# Altium footprint library Atlan.PcbLib: 283 footprints (part 7 of 18)
Each footprint in its own frame and in the unit in brackets; x right, y up, seen from the top. Pads: shape width x height; smd on the part's side, far side on the other; paste and mask are expansions set on the pad; w line width, h text height; cw(c..) or ccw(c..) is an arc to the next point about the centre after c.
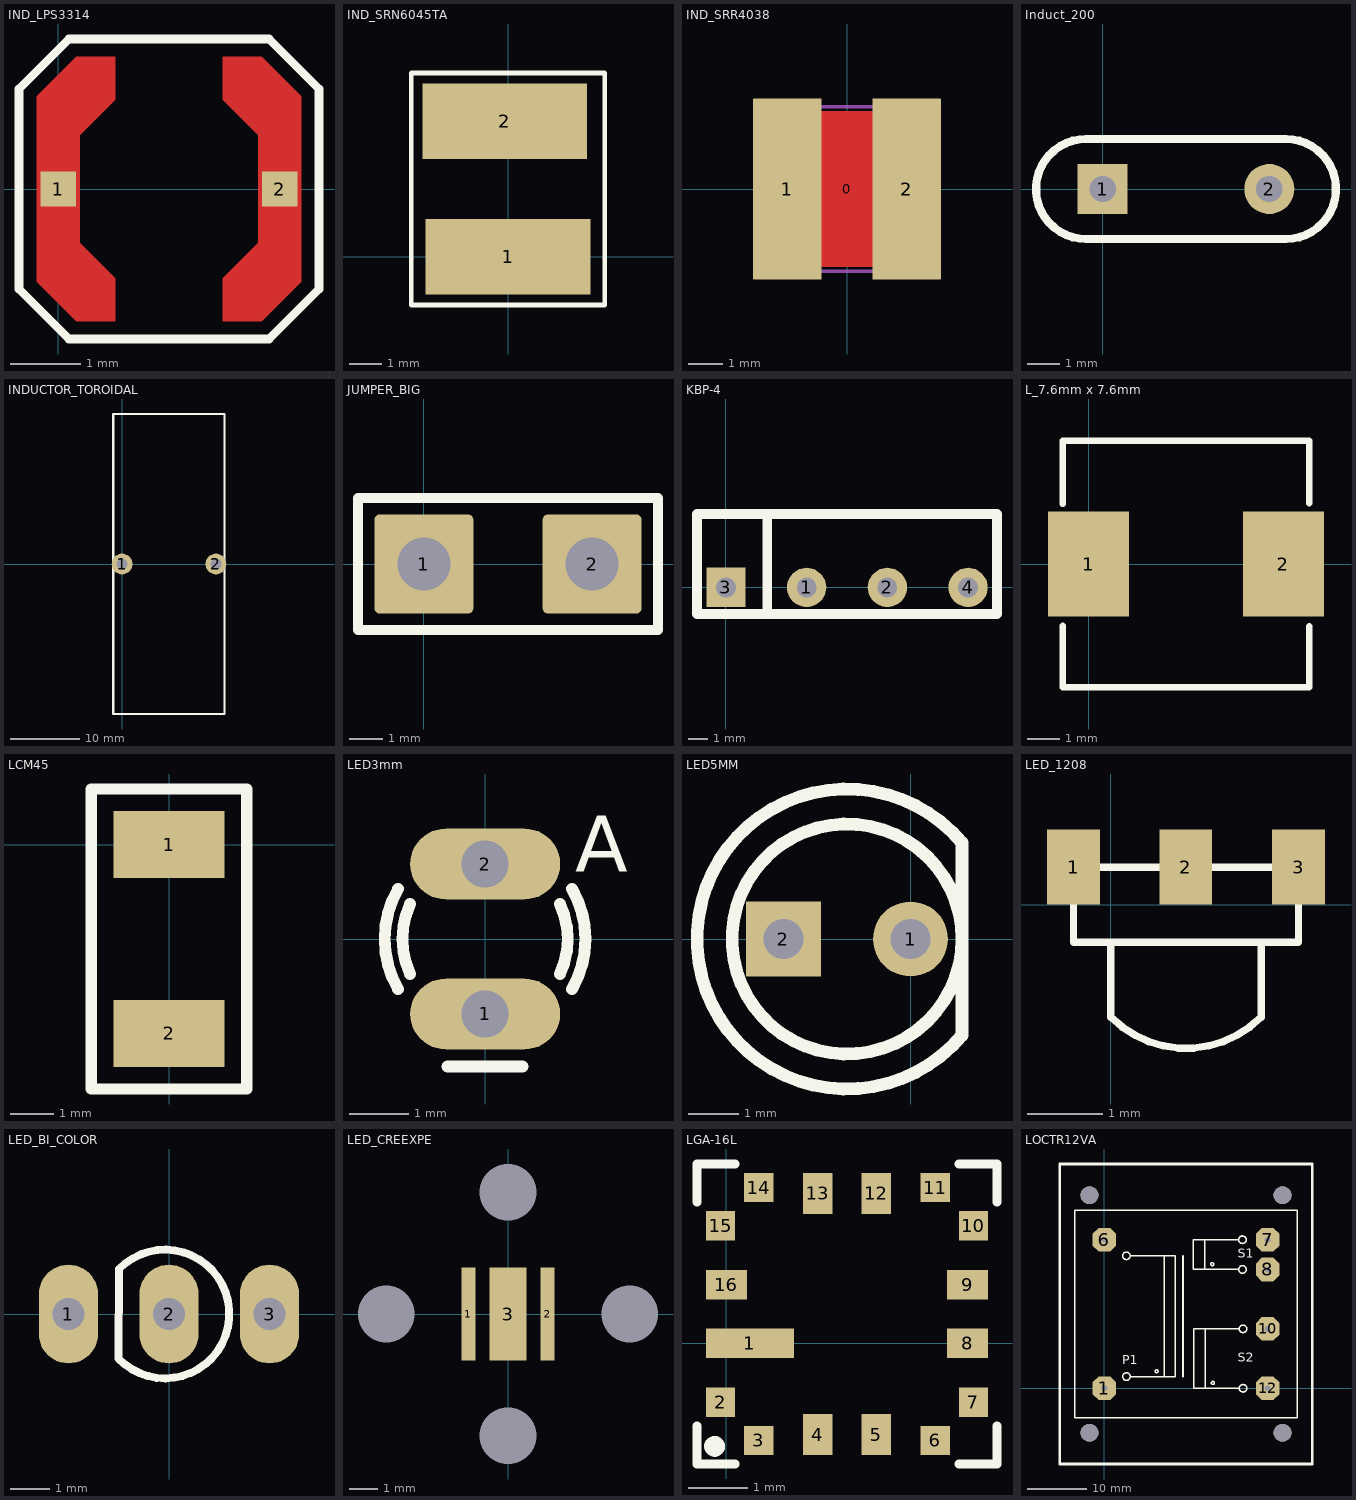
[diagram p6: the footprints below, top view; thin cyan lines are the x and y axes]

## IND_LPS3314 [mm] "Inductor"
pads (4):
  round 0 smd paste-25.4 mask-25.4: 1(0,0) 2(3.15,0)
  rect 0.5x0.5 smd: 1(0,0) 2(3.15,0)
Top Layer:
  region: 2.896,-1.88 3.454,-1.321 3.454,1.321 2.896,1.88 2.337,1.88 2.337,1.27 2.845,0.762 2.845,-0.762 2.337,-1.27 2.337,-1.88
  region: 0.254,1.88 -0.305,1.321 -0.305,-1.321 0.254,-1.88 0.813,-1.88 0.813,-1.27 0.305,-0.762 0.305,0.762 0.813,1.27 0.813,1.88
Top Overlay:
  lines w0.127: -0.559,-1.422 -0.559,1.422 0.152,2.134 2.997,2.134 3.708,1.422 3.708,-1.422 2.997,-2.134 0.152,-2.134 -0.559,-1.422
Top Paste:
  region: 2.896,-1.88 3.454,-1.321 3.454,1.321 2.896,1.88 2.337,1.88 2.337,1.27 2.845,0.762 2.845,-0.762 2.337,-1.27 2.337,-1.88
  region: 0.254,1.88 -0.305,1.321 -0.305,-1.321 0.254,-1.88 0.813,-1.88 0.813,-1.27 0.305,-0.762 0.305,0.762 0.813,1.27 0.813,1.88
Top Solder:
  region: 2.973,1.957 3.532,1.399 3.564,1.321 3.564,-1.321 3.532,-1.399 2.973,-1.957 2.896,-1.99 2.337,-1.99 2.259,-1.957 2.227,-1.88 2.227,-1.27 2.259,-1.192 2.735,-0.716 2.735,0.716 2.259,1.192 2.227,1.27 2.227,1.88 2.259,1.957 2.337,1.99 2.896,1.99
  region: 0.891,1.957 0.923,1.88 0.923,1.27 0.891,1.192 0.415,0.716 0.415,-0.716 0.891,-1.192 0.923,-1.27 0.923,-1.88 0.891,-1.957 0.813,-1.99 0.254,-1.99 0.176,-1.957 -0.383,-1.399 -0.415,-1.321 -0.415,1.321 -0.383,1.399 0.176,1.957 0.254,1.99 0.813,1.99
3D body: height 3, standoff 0, extent -0.6,-2.2 3.7,2.1

## IND_SRN6045TA [mm]
height 4.2
pads (2):
  rect 5.1x2.35 smd mask+0.02: 1(0,0) 2(-0.1,4.2)
Top Overlay:
  lines w0.15: -3,-1.5 -3,5.7 3,5.7 3,-1.5 -3,-1.5

## IND_SRR4038 [mm] "Shielded Power Inductor, Body 4.8x4.8x3.8mm"
height 3.8
pads (3):
  round 0.5 on Mech15: 0(0,0)
  rrect1% 2x5.3 smd: 1(-1.75,0) 2(1.75,0)
Top Layer:
  pour cut-out: -1.524,2.286 1.524,2.286 1.524,-2.286 -1.524,-2.286
Mechanical 13:
  lines w0.076: -2,-1.275 -2,1.325 -1.325,2 1.325,2 2,1.325 2,-1.275 1.275,-2 -1.275,-2 -2,-1.275
Mechanical 15:
  lines w0.1: -2.413,-1.651 -1.651,-2.413 1.651,-2.413 2.413,-1.651 2.413,1.651 1.651,2.413 -1.651,2.413 -2.413,1.651 -2.413,-1.651
3D body "Inductor Coilcraft LPS4018.STEP": height 1.79, standoff -0.01, extent -2,-2 2,2

## Induct_200 [mil] "Inductor"
pads (2):
  rect 60x60 hole 31.5: 1(0,0)
  round 60 hole 31.5: 2(200,0)
Top Overlay:
  lines w10: -20,-60 cw(c-20,0) -20,60 220,60 cw(c220,0) 220,-60 -20,-60

## INDUCTOR_TOROIDAL [mm]
pads (2):
  round 3 hole 1.6: 1(0,0) 2(13.5,0)
Top Overlay:
  lines w0.3: -1.27,-21.59 14.732,-21.59 14.732,21.59 -1.27,21.59 -1.27,-21.59

## JUMPER_BIG [mm]
pads (2):
  rrect10% 3x3 hole 1.6: 1(0,0) 2(5.1,0)
Top Overlay:
  lines w0.3: -2,-2 -2,2 7.1,2 7.1,-2 -2,-2

## KBP-4 [mm]
pads (4):
  round 2 hole 1: 1(4.1,0) 2(8.2,0) 4(12.3,0)
  rect 2x2 hole 1: 3(0,0)
Top Overlay:
  lines w0.5: 0.75,-1.35 2.1,-1.35 2.1,3.73 ; -1.47,-1.35 -1.47,3.73 13.77,3.73 13.77,-1.35 -1.47,-1.35
3D body "BRIDGE_1.STEP": height 11.68, standoff -3, extent -1.5,-1.38 13.74,3.7

## L_7.6mm x 7.6mm [mm]
pads (2):
  rect 2.5x3.25 smd: 1(0,0) 2(6,0)
Top Overlay:
  lines w0.2: -0.8,-1.9 -0.8,-3.8 6.8,-3.8 6.8,-1.925 ; -0.8,1.85 -0.8,3.8 6.8,3.8 6.8,1.875
3D body: height 4.5, standoff 0, extent -0.8,-3.8 6.8,3.8

## LCM45 [mil]
pads (2):
  rect 100x60 smd: 1(0,0) 2(0,-170)
Top Overlay:
  lines w10: -70,-220 -70,50 70,50 70,-220 -70,-220

## LED3mm [mm] "Led THT Round 3mm"
pads (2):
  oval 2.54x1.2 hole 0.8: 1(0,-1.27) 2(0,1.27)
Top Overlay:
  lines w0.2: -1.472,-0.85 cw(c0,0) -1.472,0.85 ; -1.269,-0.592 cw(c0,0) -1.269,0.592 ; -0.635,-2.159 0.635,-2.159 ; 1.269,-0.592 ccw(c0,0) 1.269,0.592 ; 1.472,-0.85 ccw(c0,0) 1.472,0.85
  text "A" at 1.524,1.143 h0.95
3D body "LED_3mm.stp": height 27.3, standoff -2.4, extent -1.917,-1.77 1.876,1.88

## LED5MM [mm]
pads (2):
  round 1.5 hole 0.8: 1(0,0)
  rect 1.5x1.5 hole 0.8: 2(-2.54,0)
Top Overlay:
  circle w0.254: c-1.27,0 r2.3
  lines w0.254: 1.028,-1.928 cw(c-1.27,0) 1.028,1.928 1.028,-1.928

## LED_1208 [mm]
pads (3):
  rect 0.7x1 smd mask+0.04: 1(-0.5,0.5) 2(1,0.5) 3(2.5,0.5)
Top Overlay:
  lines w0.1: 0,-0.5 0,-1.5 ccw(c1,-0.5) 2,-1.5 2,-0.5 ; -0.5,-0.5 -0.5,0.5 2.5,0.5 2.5,-0.5 1.5,-0.5 -0.5,-0.5

## LED_BI_COLOR [mm] "LED, BI-Color, Common cathode"
height 5
pads (3):
  oval 1.5x2.5 hole 0.8: 1(-2.54,0) 2(0,0) 3(2.54,0)
Top Overlay:
  lines w0.2: -1.276,-1.123 ccw(c-0.101,0.001) -1.264,1.137 -1.276,-1.123
3D body "Bi-Color LED - Common Cathode v3.step": height 27.3, standoff -6.5, extent -2.77,-1.9 2.77,1.9

## LED_CREEXPE [mm]
pads (7):
  round 0 hole 2 unplated: 0(-4.3,0) 0(0,-4.3) 0(0,4.3) 0(4.3,0)
  rect 0.5x3.3 smd: 1(-1.4,0) 2(1.4,0)
  rect 1.3x3.3 smd: 3(0,0)

## LGA-16L [mm]
height 1.7
pads (16):
  rect 1.5x0.5 smd mask+0.05: 1(0.4,0)
  rect 0.5x0.5 smd mask+0.05: 2(-0.1,-1) 3(0.55,-1.65) 6(3.55,-1.65) 7(4.2,-1) 10(4.2,2) 11(3.55,2.65) 14(0.55,2.65) 15(-0.1,2)
  rect 0.5x0.7 smd mask+0.05: 4(1.55,-1.55) 5(2.55,-1.55) 12(2.55,2.55) 13(1.55,2.55)
  rect 0.7x0.5 smd mask+0.05: 8(4.1,0) 9(4.1,1) 16(0,1)
Top Overlay:
  circle w0.254: c-0.2,-1.75 r0.05
  lines w0.15: -0.5,-1.4 -0.5,-2.05 0.15,-2.05 ; -0.5,2.4 -0.5,3.05 0.15,3.05 ; 3.95,-2.05 4.6,-2.05 4.6,-1.4 ; 3.95,3.05 4.6,3.05 4.6,2.4
3D body: height 1.7, standoff 0, extent -0.45,-2 4.55,3

## LOCTR12VA [mm]
pads (10):
  oct 4x4 hole 1: 1(0,0) 6(0,25) 7(27.5,25) 8(27.5,20) 10(27.5,10) 12(27.5,0)
  round 3 hole 3 unplated: ""(-2.5,-7.5) ""(-2.5,32.5) ""(30,-7.5) ""(30,32.5)
Top Overlay:
  drawing of 425 lines, arcs and shapes, not listed
  text "P1" at 3,4 h1.52
  text "S2" at 22.5,4.5 h1.52
  text "S1" at 22.5,22 h1.52